# Altium schematic symbol library jlcpcb_2025_04_inductors_extended_0805.schlib: 882 symbols (part 2 of 5) (continued)
## FHW0805UC036JGT (continued)
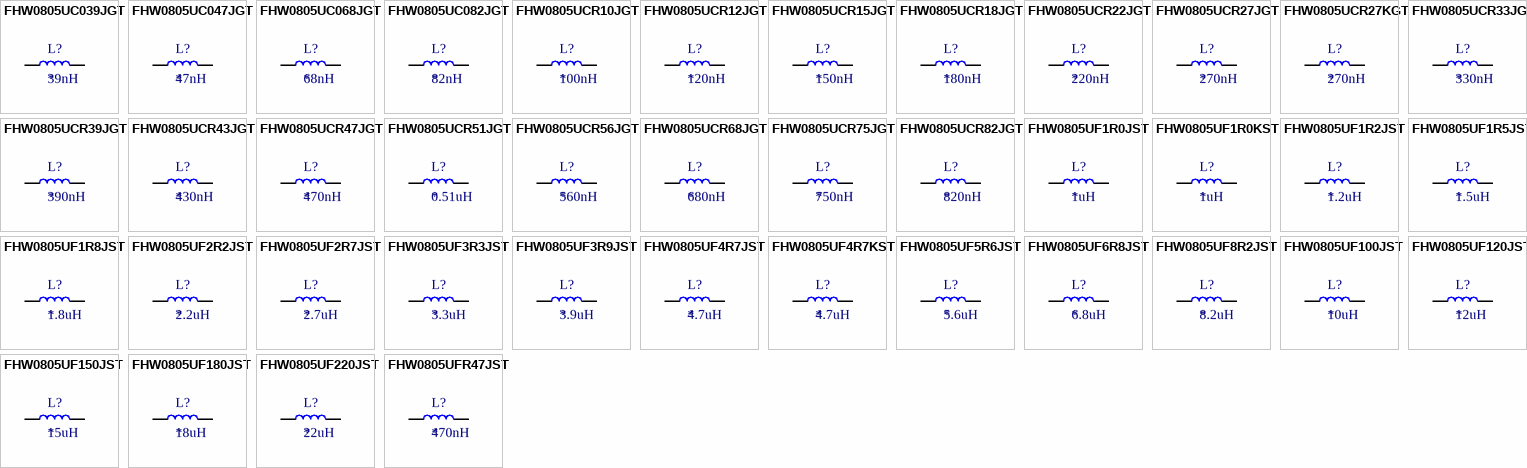
[diagram p7: symbols FHW0805UC039JGT to FHW0805UFR47JST]

## FHW0805UC039JGT
designator L?  Inductance: 39nH
Inductor, 39nH, ±5%, 290mΩ, 500mA, SMD 0805; Manufacturer: FH(Guangdong Fenghua Advanced Tech); Manufacturer Part Number: FHW0805UC039JGT; Self-Resonant Frequency: 2GHz; Q Factor: 55@500MHz; Package Size: 0805; JLCPCB Basic Part: No; JLCPCB Part Number: C112912; Supplier 1: LCSC; Category: Inductors; Supplier Part Number 1: C112912; Tolerance: ±5%; Rated Current: 500mA; DC Resistance: 290mΩ; RoHS: Yes; ComponentLink1Description: Datasheet; ComponentLink1URL: https://wmsc.lcsc.com/wmsc/upload/file/pdf/v2/lcsc/2302231030_FH--Guangdong-Fenghua-Advanced-Tech-FHW0805UC039JGT_C112912.pdf; ComponentLink2Description: JLCPCB Part URL; ComponentLink2URL: https://jlcpcb.com/partdetail/C112912; ComponentLink3Description: LCSC Part URL; ComponentLink3URL: https://lcsc.com/product-detail/Inductors-SMD_FH-Guangdong-Fenghua-Advanced-Tech-FH-Guangdong-Fenghua-Advanced-Tech-FHW0805UC039JGT_C112912.html
footprint IND-0805 (0805 (2012M) Inductor)
pins: 1, 2

## FHW0805UC047JGT
designator L?  Inductance: 47nH
Inductor, 47nH, ±5%, 310mΩ, 500mA, SMD 0805; Manufacturer: FH(Guangdong Fenghua Advanced Tech); Manufacturer Part Number: FHW0805UC047JGT; Self-Resonant Frequency: 1.65GHz; Q Factor: 55@500MHz; Package Size: 0805; JLCPCB Basic Part: No; JLCPCB Part Number: C113330; Supplier 1: LCSC; Category: Inductors; Supplier Part Number 1: C113330; Tolerance: ±5%; Rated Current: 500mA; DC Resistance: 310mΩ; RoHS: Yes; ComponentLink1Description: Datasheet; ComponentLink1URL: https://wmsc.lcsc.com/wmsc/upload/file/pdf/v2/lcsc/2302231030_FH--Guangdong-Fenghua-Advanced-Tech-FHW0805UC047JGT_C113330.pdf; ComponentLink2Description: JLCPCB Part URL; ComponentLink2URL: https://jlcpcb.com/partdetail/C113330; ComponentLink3Description: LCSC Part URL; ComponentLink3URL: https://lcsc.com/product-detail/Inductors-SMD_FH-Guangdong-Fenghua-Advanced-Tech-FH-Guangdong-Fenghua-Advanced-Tech-FHW0805UC047JGT_C113330.html
footprint IND-0805 (0805 (2012M) Inductor)
pins: 1, 2

## FHW0805UC068JGT
designator L?  Inductance: 68nH
Inductor, 68nH, ±5%, 380mΩ, 500mA, SMD 0805; Manufacturer: FH(Guangdong Fenghua Advanced Tech); Manufacturer Part Number: FHW0805UC068JGT; Self-Resonant Frequency: 1.45GHz; Q Factor: 55@500MHz; Package Size: 0805; JLCPCB Basic Part: No; JLCPCB Part Number: C113329; Supplier 1: LCSC; Category: Inductors; Supplier Part Number 1: C113329; Tolerance: ±5%; Rated Current: 500mA; DC Resistance: 380mΩ; RoHS: Yes; ComponentLink1Description: Datasheet; ComponentLink1URL: https://wmsc.lcsc.com/wmsc/upload/file/pdf/v2/lcsc/2302231030_FH--Guangdong-Fenghua-Advanced-Tech-FHW0805UC068JGT_C113329.pdf; ComponentLink2Description: JLCPCB Part URL; ComponentLink2URL: https://jlcpcb.com/partdetail/C113329; ComponentLink3Description: LCSC Part URL; ComponentLink3URL: https://lcsc.com/product-detail/Inductors-SMD_FH-Guangdong-Fenghua-Advanced-Tech-FH-Guangdong-Fenghua-Advanced-Tech-FHW0805UC068JGT_C113329.html
footprint IND-0805 (0805 (2012M) Inductor)
pins: 1, 2

## FHW0805UC082JGT
designator L?  Inductance: 82nH
Inductor, 82nH, ±5%, 420mΩ, 400mA, SMD 0805; Manufacturer: FH(Guangdong Fenghua Advanced Tech); Manufacturer Part Number: FHW0805UC082JGT; Self-Resonant Frequency: 1.3GHz; Q Factor: 55@500MHz; Package Size: 0805; JLCPCB Basic Part: No; JLCPCB Part Number: C108961; Supplier 1: LCSC; Category: Inductors; Supplier Part Number 1: C108961; Tolerance: ±5%; Rated Current: 400mA; DC Resistance: 420mΩ; RoHS: Yes; ComponentLink1Description: Datasheet; ComponentLink1URL: https://wmsc.lcsc.com/wmsc/upload/file/pdf/v2/lcsc/2302231030_FH--Guangdong-Fenghua-Advanced-Tech-FHW0805UC082JGT_C108961.pdf; ComponentLink2Description: JLCPCB Part URL; ComponentLink2URL: https://jlcpcb.com/partdetail/C108961; ComponentLink3Description: LCSC Part URL; ComponentLink3URL: https://lcsc.com/product-detail/Inductors-SMD_FH-Guangdong-Fenghua-Advanced-Tech-FH-Guangdong-Fenghua-Advanced-Tech-FHW0805UC082JGT_C108961.html
footprint IND-0805 (0805 (2012M) Inductor)
pins: 1, 2

## FHW0805UCR10JGT
designator L?  Inductance: 100nH
Inductor, 100nH, ±5%, 460mΩ, 400mA, SMD 0805; Manufacturer: FH(Guangdong Fenghua Advanced Tech); Manufacturer Part Number: FHW0805UCR10JGT; Self-Resonant Frequency: 1.2GHz; Q Factor: 50@500MHz; Package Size: 0805; JLCPCB Basic Part: No; JLCPCB Part Number: C108075; Supplier 1: LCSC; Category: Inductors; Supplier Part Number 1: C108075; Tolerance: ±5%; Rated Current: 400mA; DC Resistance: 460mΩ; RoHS: Yes; ComponentLink1Description: Datasheet; ComponentLink1URL: https://wmsc.lcsc.com/wmsc/upload/file/pdf/v2/lcsc/2302231030_FH--Guangdong-Fenghua-Advanced-Tech-FHW0805UCR10JGT_C108075.pdf; ComponentLink2Description: JLCPCB Part URL; ComponentLink2URL: https://jlcpcb.com/partdetail/C108075; ComponentLink3Description: LCSC Part URL; ComponentLink3URL: https://lcsc.com/product-detail/Inductors-SMD_FH-Guangdong-Fenghua-Advanced-Tech-FH-Guangdong-Fenghua-Advanced-Tech-FHW0805UCR10JGT_C108075.html
footprint IND-0805 (0805 (2012M) Inductor)
pins: 1, 2

## FHW0805UCR12JGT
designator L?  Inductance: 120nH
Inductor, 120nH, ±5%, 510mΩ, 400mA, SMD 0805; Manufacturer: FH(Guangdong Fenghua Advanced Tech); Manufacturer Part Number: FHW0805UCR12JGT; Self-Resonant Frequency: 1.1GHz; Q Factor: 45@250MHz; Package Size: 0805; JLCPCB Basic Part: No; JLCPCB Part Number: C139260; Supplier 1: LCSC; Category: Inductors; Supplier Part Number 1: C139260; Tolerance: ±5%; Rated Current: 400mA; DC Resistance: 510mΩ; RoHS: Yes; ComponentLink1Description: Datasheet; ComponentLink1URL: https://wmsc.lcsc.com/wmsc/upload/file/pdf/v2/lcsc/2302231230_FH--Guangdong-Fenghua-Advanced-Tech-FHW0805UCR12JGT_C139260.pdf; ComponentLink2Description: JLCPCB Part URL; ComponentLink2URL: https://jlcpcb.com/partdetail/C139260; ComponentLink3Description: LCSC Part URL; ComponentLink3URL: https://lcsc.com/product-detail/Inductors-SMD_FH-Guangdong-Fenghua-Advanced-Tech-FH-Guangdong-Fenghua-Advanced-Tech-FHW0805UCR12JGT_C139260.html
footprint IND-0805 (0805 (2012M) Inductor)
pins: 1, 2

## FHW0805UCR15JGT
designator L?  Inductance: 150nH
Inductor, 150nH, ±5%, 560mΩ, 400mA, SMD 0805; Manufacturer: FH(Guangdong Fenghua Advanced Tech); Manufacturer Part Number: FHW0805UCR15JGT; Self-Resonant Frequency: 920MHz; Q Factor: 45@250MHz; Package Size: 0805; JLCPCB Basic Part: No; JLCPCB Part Number: C139261; Supplier 1: LCSC; Category: Inductors; Supplier Part Number 1: C139261; Tolerance: ±5%; Rated Current: 400mA; DC Resistance: 560mΩ; RoHS: Yes; ComponentLink1Description: Datasheet; ComponentLink1URL: https://wmsc.lcsc.com/wmsc/upload/file/pdf/v2/lcsc/2302231230_FH--Guangdong-Fenghua-Advanced-Tech-FHW0805UCR15JGT_C139261.pdf; ComponentLink2Description: JLCPCB Part URL; ComponentLink2URL: https://jlcpcb.com/partdetail/C139261; ComponentLink3Description: LCSC Part URL; ComponentLink3URL: https://lcsc.com/product-detail/Inductors-SMD_FH-Guangdong-Fenghua-Advanced-Tech-FH-Guangdong-Fenghua-Advanced-Tech-FHW0805UCR15JGT_C139261.html
footprint IND-0805 (0805 (2012M) Inductor)
pins: 1, 2

## FHW0805UCR18JGT
designator L?  Inductance: 180nH
Inductor, 180nH, ±5%, 640mΩ, 400mA, SMD 0805; Manufacturer: FH(Guangdong Fenghua Advanced Tech); Manufacturer Part Number: FHW0805UCR18JGT; Self-Resonant Frequency: 870MHz; Q Factor: 45@250MHz; Package Size: 0805; JLCPCB Basic Part: No; JLCPCB Part Number: C75638; Supplier 1: LCSC; Category: Inductors; Supplier Part Number 1: C75638; Tolerance: ±5%; Rated Current: 400mA; DC Resistance: 640mΩ; RoHS: Yes; ComponentLink1Description: Datasheet; ComponentLink1URL: https://wmsc.lcsc.com/wmsc/upload/file/pdf/v2/lcsc/2302231101_FH--Guangdong-Fenghua-Advanced-Tech-FHW0805UCR18JGT_C75638.pdf; ComponentLink2Description: JLCPCB Part URL; ComponentLink2URL: https://jlcpcb.com/partdetail/C75638; ComponentLink3Description: LCSC Part URL; ComponentLink3URL: https://lcsc.com/product-detail/Inductors-SMD_FH-Guangdong-Fenghua-Advanced-Tech-FH-Guangdong-Fenghua-Advanced-Tech-FHW0805UCR18JGT_C75638.html
footprint IND-0805 (0805 (2012M) Inductor)
pins: 1, 2

## FHW0805UCR22JGT
designator L?  Inductance: 220nH
Inductor, 220nH, ±5%, 1.05Ω, 400mA, SMD 0805; Manufacturer: FH(Guangdong Fenghua Advanced Tech); Manufacturer Part Number: FHW0805UCR22JGT; Self-Resonant Frequency: 850MHz; Q Factor: 40@250MHz; Package Size: 0805; JLCPCB Basic Part: No; JLCPCB Part Number: C108960; Supplier 1: LCSC; Category: Inductors; Supplier Part Number 1: C108960; Tolerance: ±5%; Rated Current: 400mA; DC Resistance: 1.05Ω; RoHS: Yes; ComponentLink1Description: Datasheet; ComponentLink1URL: https://wmsc.lcsc.com/wmsc/upload/file/pdf/v2/lcsc/2302231030_FH--Guangdong-Fenghua-Advanced-Tech-FHW0805UCR22JGT_C108960.pdf; ComponentLink2Description: JLCPCB Part URL; ComponentLink2URL: https://jlcpcb.com/partdetail/C108960; ComponentLink3Description: LCSC Part URL; ComponentLink3URL: https://lcsc.com/product-detail/Inductors-SMD_FH-Guangdong-Fenghua-Advanced-Tech-FH-Guangdong-Fenghua-Advanced-Tech-FHW0805UCR22JGT_C108960.html
footprint IND-0805 (0805 (2012M) Inductor)
pins: 1, 2

## FHW0805UCR27JGT
designator L?  Inductance: 270nH
Inductor, 270nH, ±5%, 1.1Ω, 350mA, SMD 0805; Manufacturer: FH(Guangdong Fenghua Advanced Tech); Manufacturer Part Number: FHW0805UCR27JGT; Self-Resonant Frequency: 650MHz; Q Factor: 40@250MHz; Package Size: 0805; JLCPCB Basic Part: No; JLCPCB Part Number: C139262; Supplier 1: LCSC; Category: Inductors; Supplier Part Number 1: C139262; Tolerance: ±5%; Rated Current: 350mA; DC Resistance: 1.1Ω; RoHS: Yes; ComponentLink1Description: Datasheet; ComponentLink1URL: https://wmsc.lcsc.com/wmsc/upload/file/pdf/v2/lcsc/2302231230_FH--Guangdong-Fenghua-Advanced-Tech-FHW0805UCR27JGT_C139262.pdf; ComponentLink2Description: JLCPCB Part URL; ComponentLink2URL: https://jlcpcb.com/partdetail/C139262; ComponentLink3Description: LCSC Part URL; ComponentLink3URL: https://lcsc.com/product-detail/Inductors-SMD_FH-Guangdong-Fenghua-Advanced-Tech-FH-Guangdong-Fenghua-Advanced-Tech-FHW0805UCR27JGT_C139262.html
footprint IND-0805 (0805 (2012M) Inductor)
pins: 1, 2

## FHW0805UCR27KGT
designator L?  Inductance: 270nH
Inductor, 270nH, ±10%, 1.1Ω, 350mA, SMD 0805; Manufacturer: FH(Guangdong Fenghua Advanced Tech); Manufacturer Part Number: FHW0805UCR27KGT; Package Size: 0805; JLCPCB Basic Part: No; JLCPCB Part Number: C295705; Supplier 1: LCSC; Category: Inductors; Supplier Part Number 1: C295705; Tolerance: ±10%; Rated Current: 350mA; DC Resistance: 1.1Ω; RoHS: Yes; ComponentLink1Description: Datasheet; ComponentLink1URL: https://wmsc.lcsc.com/wmsc/upload/file/pdf/v2/lcsc/2302231208_FH--Guangdong-Fenghua-Advanced-Tech-FHW0805UCR27KGT_C295705.pdf; ComponentLink2Description: JLCPCB Part URL; ComponentLink2URL: https://jlcpcb.com/partdetail/C295705; ComponentLink3Description: LCSC Part URL; ComponentLink3URL: https://lcsc.com/product-detail/Inductors-SMD_FH-Guangdong-Fenghua-Advanced-Tech-FH-Guangdong-Fenghua-Advanced-Tech-FHW0805UCR27KGT_C295705.html
footprint IND-0805 (0805 (2012M) Inductor)
pins: 1, 2

## FHW0805UCR33JGT
designator L?  Inductance: 330nH
Inductor, 330nH, ±5%, 1.4Ω, 310mA, SMD 0805; Manufacturer: FH(Guangdong Fenghua Advanced Tech); Manufacturer Part Number: FHW0805UCR33JGT; Self-Resonant Frequency: 600MHz; Q Factor: 40@250MHz; Package Size: 0805; JLCPCB Basic Part: No; JLCPCB Part Number: C139263; Supplier 1: LCSC; Category: Inductors; Supplier Part Number 1: C139263; Tolerance: ±5%; Rated Current: 310mA; DC Resistance: 1.4Ω; RoHS: Yes; ComponentLink1Description: Datasheet; ComponentLink1URL: https://wmsc.lcsc.com/wmsc/upload/file/pdf/v2/lcsc/2302231230_FH--Guangdong-Fenghua-Advanced-Tech-FHW0805UCR33JGT_C139263.pdf; ComponentLink2Description: JLCPCB Part URL; ComponentLink2URL: https://jlcpcb.com/partdetail/C139263; ComponentLink3Description: LCSC Part URL; ComponentLink3URL: https://lcsc.com/product-detail/Inductors-SMD_FH-Guangdong-Fenghua-Advanced-Tech-FH-Guangdong-Fenghua-Advanced-Tech-FHW0805UCR33JGT_C139263.html
footprint IND-0805 (0805 (2012M) Inductor)
pins: 1, 2

## FHW0805UCR39JGT
designator L?  Inductance: 390nH
Inductor, 390nH, ±5%, 1.5Ω, 290mA, SMD 0805; Manufacturer: FH(Guangdong Fenghua Advanced Tech); Manufacturer Part Number: FHW0805UCR39JGT; Self-Resonant Frequency: 560MHz; Q Factor: 40@250MHz; Package Size: 0805; JLCPCB Basic Part: No; JLCPCB Part Number: C108076; Supplier 1: LCSC; Category: Inductors; Supplier Part Number 1: C108076; Tolerance: ±5%; Rated Current: 290mA; DC Resistance: 1.5Ω; RoHS: Yes; ComponentLink1Description: Datasheet; ComponentLink1URL: https://wmsc.lcsc.com/wmsc/upload/file/pdf/v2/lcsc/2302231030_FH--Guangdong-Fenghua-Advanced-Tech-FHW0805UCR39JGT_C108076.pdf; ComponentLink2Description: JLCPCB Part URL; ComponentLink2URL: https://jlcpcb.com/partdetail/C108076; ComponentLink3Description: LCSC Part URL; ComponentLink3URL: https://lcsc.com/product-detail/Inductors-SMD_FH-Guangdong-Fenghua-Advanced-Tech-FH-Guangdong-Fenghua-Advanced-Tech-FHW0805UCR39JGT_C108076.html
footprint IND-0805 (0805 (2012M) Inductor)
pins: 1, 2

## FHW0805UCR43JGT
designator L?  Inductance: 430nH
Inductor, 430nH, ±5%, SMD 0805; Manufacturer: FH(Guangdong Fenghua Advanced Tech); Manufacturer Part Number: FHW0805UCR43JGT; Package Size: 0805; JLCPCB Basic Part: No; JLCPCB Part Number: C395042; Supplier 1: LCSC; Category: Inductors; Supplier Part Number 1: C395042; Tolerance: ±5%; RoHS: Yes; ComponentLink1Description: Datasheet; ComponentLink1URL: https://wmsc.lcsc.com/wmsc/upload/file/pdf/v2/lcsc/2302231208_FH--Guangdong-Fenghua-Advanced-Tech-FHW0805UCR43JGT_C395042.pdf; ComponentLink2Description: JLCPCB Part URL; ComponentLink2URL: https://jlcpcb.com/partdetail/C395042; ComponentLink3Description: LCSC Part URL; ComponentLink3URL: https://lcsc.com/product-detail/Inductors-SMD_FH-Guangdong-Fenghua-Advanced-Tech-FH-Guangdong-Fenghua-Advanced-Tech-FHW0805UCR43JGT_C395042.html
footprint IND-0805 (0805 (2012M) Inductor)
pins: 1, 2

## FHW0805UCR47JGT
designator L?  Inductance: 470nH
Inductor, 470nH, ±5%, 2Ω, 250mA, SMD 0805; Manufacturer: FH(Guangdong Fenghua Advanced Tech); Manufacturer Part Number: FHW0805UCR47JGT; Self-Resonant Frequency: 375MHz; Q Factor: 33@100MHz; Package Size: 0805; JLCPCB Basic Part: No; JLCPCB Part Number: C115159; Supplier 1: LCSC; Category: Inductors; Supplier Part Number 1: C115159; Tolerance: ±5%; Rated Current: 250mA; DC Resistance: 2Ω; RoHS: Yes; ComponentLink1Description: Datasheet; ComponentLink1URL: https://wmsc.lcsc.com/wmsc/upload/file/pdf/v2/lcsc/2302231230_FH--Guangdong-Fenghua-Advanced-Tech-FHW0805UCR47JGT_C115159.pdf; ComponentLink2Description: JLCPCB Part URL; ComponentLink2URL: https://jlcpcb.com/partdetail/C115159; ComponentLink3Description: LCSC Part URL; ComponentLink3URL: https://lcsc.com/product-detail/Inductors-SMD_FH-Guangdong-Fenghua-Advanced-Tech-FH-Guangdong-Fenghua-Advanced-Tech-FHW0805UCR47JGT_C115159.html
footprint IND-0805 (0805 (2012M) Inductor)
pins: 1, 2

## FHW0805UCR51JGT
designator L?  Inductance: 0.51uH
Inductor, 0.51uH, ±5%, SMD 0805; Manufacturer: FH (Guangdong Fenghua Advanced Tech); Manufacturer Part Number: FHW0805UCR51JGT; Package Size: 0805; JLCPCB Basic Part: No; JLCPCB Part Number: C433880; Supplier 1: LCSC; Category: Inductors; Supplier Part Number 1: C433880; Tolerance: ±5%; RoHS: Yes; ComponentLink1Description: Datasheet; ComponentLink1URL: https://wmsc.lcsc.com/wmsc/upload/file/pdf/v2/lcsc/2302231130_FH--Guangdong-Fenghua-Advanced-Tech-FHW0805UCR51JGT_C433880.pdf; ComponentLink2Description: JLCPCB Part URL; ComponentLink2URL: https://jlcpcb.com/partdetail/C433880; ComponentLink3Description: LCSC Part URL; ComponentLink3URL: https://lcsc.com/product-detail/Inductors-SMD_FH-Guangdong-Fenghua-Advanced-Tech-FH-Guangdong-Fenghua-Advanced-Tech-FHW0805UCR51JGT_C433880.html
footprint IND-0805 (0805 (2012M) Inductor)
pins: 1, 2

## FHW0805UCR56JGT
designator L?  Inductance: 560nH
Inductor, 560nH, ±5%, 1.9Ω, 230mA, SMD 0805; Manufacturer: FH(Guangdong Fenghua Advanced Tech); Manufacturer Part Number: FHW0805UCR56JGT; Self-Resonant Frequency: 340MHz; Q Factor: 23@50MHz; Package Size: 0805; JLCPCB Basic Part: No; JLCPCB Part Number: C139264; Supplier 1: LCSC; Category: Inductors; Supplier Part Number 1: C139264; Tolerance: ±5%; Rated Current: 230mA; DC Resistance: 1.9Ω; RoHS: Yes; ComponentLink1Description: Datasheet; ComponentLink1URL: https://wmsc.lcsc.com/wmsc/upload/file/pdf/v2/lcsc/2302231230_FH--Guangdong-Fenghua-Advanced-Tech-FHW0805UCR56JGT_C139264.pdf; ComponentLink2Description: JLCPCB Part URL; ComponentLink2URL: https://jlcpcb.com/partdetail/C139264; ComponentLink3Description: LCSC Part URL; ComponentLink3URL: https://lcsc.com/product-detail/Inductors-SMD_FH-Guangdong-Fenghua-Advanced-Tech-FH-Guangdong-Fenghua-Advanced-Tech-FHW0805UCR56JGT_C139264.html
footprint IND-0805 (0805 (2012M) Inductor)
pins: 1, 2

## FHW0805UCR68JGT
designator L?  Inductance: 680nH
Inductor, 680nH, ±5%, 2.1Ω, 190mA, SMD 0805; Manufacturer: FH(Guangdong Fenghua Advanced Tech); Manufacturer Part Number: FHW0805UCR68JGT; Self-Resonant Frequency: 300MHz; Q Factor: 23@50MHz; Package Size: 0805; JLCPCB Basic Part: No; JLCPCB Part Number: C62554; Supplier 1: LCSC; Category: Inductors; Supplier Part Number 1: C62554; Tolerance: ±5%; Rated Current: 190mA; DC Resistance: 2.1Ω; RoHS: Yes; ComponentLink1Description: Datasheet; ComponentLink1URL: https://wmsc.lcsc.com/wmsc/upload/file/pdf/v2/lcsc/2302231300_FH--Guangdong-Fenghua-Advanced-Tech-FHW0805UCR68JGT_C62554.pdf; ComponentLink2Description: JLCPCB Part URL; ComponentLink2URL: https://jlcpcb.com/partdetail/C62554; ComponentLink3Description: LCSC Part URL; ComponentLink3URL: https://lcsc.com/product-detail/Inductors-SMD_FH-Guangdong-Fenghua-Advanced-Tech-FH-Guangdong-Fenghua-Advanced-Tech-FHW0805UCR68JGT_C62554.html
footprint IND-0805 (0805 (2012M) Inductor)
pins: 1, 2

## FHW0805UCR75JGT
designator L?  Inductance: 750nH
Inductor, 750nH, ±5%, SMD 0805; Manufacturer: FH(Guangdong Fenghua Advanced Tech); Manufacturer Part Number: FHW0805UCR75JGT; Package Size: 0805; JLCPCB Basic Part: No; JLCPCB Part Number: C395043; Supplier 1: LCSC; Category: Inductors; Supplier Part Number 1: C395043; Tolerance: ±5%; RoHS: Yes; ComponentLink1Description: Datasheet; ComponentLink1URL: https://wmsc.lcsc.com/wmsc/upload/file/pdf/v2/lcsc/2302231208_FH--Guangdong-Fenghua-Advanced-Tech-FHW0805UCR75JGT_C395043.pdf; ComponentLink2Description: JLCPCB Part URL; ComponentLink2URL: https://jlcpcb.com/partdetail/C395043; ComponentLink3Description: LCSC Part URL; ComponentLink3URL: https://lcsc.com/product-detail/Inductors-SMD_FH-Guangdong-Fenghua-Advanced-Tech-FH-Guangdong-Fenghua-Advanced-Tech-FHW0805UCR75JGT_C395043.html
footprint IND-0805 (0805 (2012M) Inductor)
pins: 1, 2

## FHW0805UCR82JGT
designator L?  Inductance: 820nH
Inductor, 820nH, ±5%, 2.14Ω, 180mA, SMD 0805; Manufacturer: FH(Guangdong Fenghua Advanced Tech); Manufacturer Part Number: FHW0805UCR82JGT; Self-Resonant Frequency: 250MHz; Q Factor: 23@50MHz; Package Size: 0805; JLCPCB Basic Part: No; JLCPCB Part Number: C139265; Supplier 1: LCSC; Category: Inductors; Supplier Part Number 1: C139265; Tolerance: ±5%; Rated Current: 180mA; DC Resistance: 2.14Ω; RoHS: Yes; ComponentLink1Description: Datasheet; ComponentLink1URL: https://wmsc.lcsc.com/wmsc/upload/file/pdf/v2/lcsc/2302231230_FH--Guangdong-Fenghua-Advanced-Tech-FHW0805UCR82JGT_C139265.pdf; ComponentLink2Description: JLCPCB Part URL; ComponentLink2URL: https://jlcpcb.com/partdetail/C139265; ComponentLink3Description: LCSC Part URL; ComponentLink3URL: https://lcsc.com/product-detail/Inductors-SMD_FH-Guangdong-Fenghua-Advanced-Tech-FH-Guangdong-Fenghua-Advanced-Tech-FHW0805UCR82JGT_C139265.html
footprint IND-0805 (0805 (2012M) Inductor)
pins: 1, 2

## FHW0805UF1R0JST
designator L?  Inductance: 1uH
Inductor, 1uH, ±5%, 1Ω, 430mA, SMD 0805; Manufacturer: FH(Guangdong Fenghua Advanced Tech); Manufacturer Part Number: FHW0805UF1R0JST; Self-Resonant Frequency: 360MHz; Q Factor: 10@7.96MHz; Package Size: 0805; JLCPCB Basic Part: No; JLCPCB Part Number: C295706; Supplier 1: LCSC; Category: Inductors; Supplier Part Number 1: C295706; Tolerance: ±5%; Rated Current: 430mA; DC Resistance: 1Ω; RoHS: Yes; ComponentLink1Description: Datasheet; ComponentLink1URL: https://wmsc.lcsc.com/wmsc/upload/file/pdf/v2/lcsc/2303141830_FH--Guangdong-Fenghua-Advanced-Tech-FHW0805UF1R0JST_C295706.pdf; ComponentLink2Description: JLCPCB Part URL; ComponentLink2URL: https://jlcpcb.com/partdetail/C295706; ComponentLink3Description: LCSC Part URL; ComponentLink3URL: https://lcsc.com/product-detail/Inductors-SMD_FH-Guangdong-Fenghua-Advanced-Tech-FH-Guangdong-Fenghua-Advanced-Tech-FHW0805UF1R0JST_C295706.html
footprint IND-0805 (0805 (2012M) Inductor)
pins: 1, 2

## FHW0805UF1R0KST
designator L?  Inductance: 1uH
Inductor, 1uH, ±10%, 1Ω, 430mA, SMD 0805; Manufacturer: FH(Guangdong Fenghua Advanced Tech); Manufacturer Part Number: FHW0805UF1R0KST; Package Size: 0805; JLCPCB Basic Part: No; JLCPCB Part Number: C295707; Supplier 1: LCSC; Category: Inductors; Supplier Part Number 1: C295707; Tolerance: ±10%; Rated Current: 430mA; DC Resistance: 1Ω; RoHS: Yes; ComponentLink1Description: Datasheet; ComponentLink1URL: https://wmsc.lcsc.com/wmsc/upload/file/pdf/v2/lcsc/2303141830_FH--Guangdong-Fenghua-Advanced-Tech-FHW0805UF1R0KST_C295707.pdf; ComponentLink2Description: JLCPCB Part URL; ComponentLink2URL: https://jlcpcb.com/partdetail/C295707; ComponentLink3Description: LCSC Part URL; ComponentLink3URL: https://lcsc.com/product-detail/Inductors-SMD_FH-Guangdong-Fenghua-Advanced-Tech-FH-Guangdong-Fenghua-Advanced-Tech-FHW0805UF1R0KST_C295707.html
footprint IND-0805 (0805 (2012M) Inductor)
pins: 1, 2

## FHW0805UF1R2JST
designator L?  Inductance: 1.2uH
Inductor, 1.2uH, ±5%, 1.15Ω, 410mA, SMD 0805; Manufacturer: FH(Guangdong Fenghua Advanced Tech); Manufacturer Part Number: FHW0805UF1R2JST; Self-Resonant Frequency: 350MHz; Q Factor: 10@7.96MHz; Package Size: 0805; JLCPCB Basic Part: No; JLCPCB Part Number: C304276; Supplier 1: LCSC; Category: Inductors; Supplier Part Number 1: C304276; Tolerance: ±5%; Rated Current: 410mA; DC Resistance: 1.15Ω; RoHS: Yes; ComponentLink1Description: Datasheet; ComponentLink1URL: https://wmsc.lcsc.com/wmsc/upload/file/pdf/v2/lcsc/2303141830_FH--Guangdong-Fenghua-Advanced-Tech-FHW0805UF1R2JST_C304276.pdf; ComponentLink2Description: JLCPCB Part URL; ComponentLink2URL: https://jlcpcb.com/partdetail/C304276; ComponentLink3Description: LCSC Part URL; ComponentLink3URL: https://lcsc.com/product-detail/Inductors-SMD_FH-Guangdong-Fenghua-Advanced-Tech-FH-Guangdong-Fenghua-Advanced-Tech-FHW0805UF1R2JST_C304276.html
footprint IND-0805 (0805 (2012M) Inductor)
pins: 1, 2

## FHW0805UF1R5JST
designator L?  Inductance: 1.5uH
Inductor, 1.5uH, ±5%, 1.2Ω, 400mA, SMD 0805; Manufacturer: FH(Guangdong Fenghua Advanced Tech); Manufacturer Part Number: FHW0805UF1R5JST; Self-Resonant Frequency: 300MHz; Q Factor: 10@7.96MHz; Package Size: 0805; JLCPCB Basic Part: No; JLCPCB Part Number: C393989; Supplier 1: LCSC; Category: Inductors; Supplier Part Number 1: C393989; Tolerance: ±5%; Rated Current: 400mA; DC Resistance: 1.2Ω; RoHS: Yes; ComponentLink1Description: Datasheet; ComponentLink1URL: https://wmsc.lcsc.com/wmsc/upload/file/pdf/v2/lcsc/2303141830_FH--Guangdong-Fenghua-Advanced-Tech-FHW0805UF1R5JST_C393989.pdf; ComponentLink2Description: JLCPCB Part URL; ComponentLink2URL: https://jlcpcb.com/partdetail/C393989; ComponentLink3Description: LCSC Part URL; ComponentLink3URL: https://lcsc.com/product-detail/Inductors-SMD_FH-Guangdong-Fenghua-Advanced-Tech-FH-Guangdong-Fenghua-Advanced-Tech-FHW0805UF1R5JST_C393989.html
footprint IND-0805 (0805 (2012M) Inductor)
pins: 1, 2

## FHW0805UF1R8JST
designator L?  Inductance: 1.8uH
Inductor, 1.8uH, ±5%, 1.35Ω, 380mA, SMD 0805; Manufacturer: FH(Guangdong Fenghua Advanced Tech); Manufacturer Part Number: FHW0805UF1R8JST; Self-Resonant Frequency: 200MHz; Q Factor: 10@7.96MHz; Package Size: 0805; JLCPCB Basic Part: No; JLCPCB Part Number: C393990; Supplier 1: LCSC; Category: Inductors; Supplier Part Number 1: C393990; Tolerance: ±5%; Rated Current: 380mA; DC Resistance: 1.35Ω; RoHS: Yes; ComponentLink1Description: Datasheet; ComponentLink1URL: https://wmsc.lcsc.com/wmsc/upload/file/pdf/v2/lcsc/2303141830_FH--Guangdong-Fenghua-Advanced-Tech-FHW0805UF1R8JST_C393990.pdf; ComponentLink2Description: JLCPCB Part URL; ComponentLink2URL: https://jlcpcb.com/partdetail/C393990; ComponentLink3Description: LCSC Part URL; ComponentLink3URL: https://lcsc.com/product-detail/Inductors-SMD_FH-Guangdong-Fenghua-Advanced-Tech-FH-Guangdong-Fenghua-Advanced-Tech-FHW0805UF1R8JST_C393990.html
footprint IND-0805 (0805 (2012M) Inductor)
pins: 1, 2

## FHW0805UF2R2JST
designator L?  Inductance: 2.2uH
Inductor, 2.2uH, ±5%, 1.5Ω, 350mA, SMD 0805; Manufacturer: FH(Guangdong Fenghua Advanced Tech); Manufacturer Part Number: FHW0805UF2R2JST; Self-Resonant Frequency: 170MHz; Q Factor: 10@7.96MHz; Package Size: 0805; JLCPCB Basic Part: No; JLCPCB Part Number: C41651; Supplier 1: LCSC; Category: Inductors; Supplier Part Number 1: C41651; Tolerance: ±5%; Rated Current: 350mA; DC Resistance: 1.5Ω; RoHS: Yes; ComponentLink1Description: Datasheet; ComponentLink1URL: https://wmsc.lcsc.com/wmsc/upload/file/pdf/v2/lcsc/2303141900_FH--Guangdong-Fenghua-Advanced-Tech-FHW0805UF2R2JST_C41651.pdf; ComponentLink2Description: JLCPCB Part URL; ComponentLink2URL: https://jlcpcb.com/partdetail/C41651; ComponentLink3Description: LCSC Part URL; ComponentLink3URL: https://lcsc.com/product-detail/Inductors-SMD_FH-Guangdong-Fenghua-Advanced-Tech-FH-Guangdong-Fenghua-Advanced-Tech-FHW0805UF2R2JST_C41651.html
footprint IND-0805 (0805 (2012M) Inductor)
pins: 1, 2

## FHW0805UF2R7JST
designator L?  Inductance: 2.7uH
Inductor, 2.7uH, ±5%, 1.7Ω, 320mA, SMD 0805; Manufacturer: FH(Guangdong Fenghua Advanced Tech); Manufacturer Part Number: FHW0805UF2R7JST; Self-Resonant Frequency: 100MHz; Q Factor: 10@7.96MHz; Package Size: 0805; JLCPCB Basic Part: No; JLCPCB Part Number: C304277; Supplier 1: LCSC; Category: Inductors; Supplier Part Number 1: C304277; Tolerance: ±5%; Rated Current: 320mA; DC Resistance: 1.7Ω; RoHS: Yes; ComponentLink1Description: Datasheet; ComponentLink1URL: https://wmsc.lcsc.com/wmsc/upload/file/pdf/v2/lcsc/2303141830_FH--Guangdong-Fenghua-Advanced-Tech-FHW0805UF2R7JST_C304277.pdf; ComponentLink2Description: JLCPCB Part URL; ComponentLink2URL: https://jlcpcb.com/partdetail/C304277; ComponentLink3Description: LCSC Part URL; ComponentLink3URL: https://lcsc.com/product-detail/Inductors-SMD_FH-Guangdong-Fenghua-Advanced-Tech-FH-Guangdong-Fenghua-Advanced-Tech-FHW0805UF2R7JST_C304277.html
footprint IND-0805 (0805 (2012M) Inductor)
pins: 1, 2

## FHW0805UF3R3JST
designator L?  Inductance: 3.3uH
Inductor, 3.3uH, ±5%, 1.8Ω, 300mA, SMD 0805; Manufacturer: FH(Guangdong Fenghua Advanced Tech); Manufacturer Part Number: FHW0805UF3R3JST; Self-Resonant Frequency: 90MHz; Q Factor: 10@7.96MHz; Package Size: 0805; JLCPCB Basic Part: No; JLCPCB Part Number: C139266; Supplier 1: LCSC; Category: Inductors; Supplier Part Number 1: C139266; Tolerance: ±5%; Rated Current: 300mA; DC Resistance: 1.8Ω; RoHS: Yes; ComponentLink1Description: Datasheet; ComponentLink1URL: https://wmsc.lcsc.com/wmsc/upload/file/pdf/v2/lcsc/2303141900_FH--Guangdong-Fenghua-Advanced-Tech-FHW0805UF3R3JST_C139266.pdf; ComponentLink2Description: JLCPCB Part URL; ComponentLink2URL: https://jlcpcb.com/partdetail/C139266; ComponentLink3Description: LCSC Part URL; ComponentLink3URL: https://lcsc.com/product-detail/Inductors-SMD_FH-Guangdong-Fenghua-Advanced-Tech-FH-Guangdong-Fenghua-Advanced-Tech-FHW0805UF3R3JST_C139266.html
footprint IND-0805 (0805 (2012M) Inductor)
pins: 1, 2

## FHW0805UF3R9JST
designator L?  Inductance: 3.9uH
Inductor, 3.9uH, ±5%, 1.95Ω, 280mA, SMD 0805; Manufacturer: FH(Guangdong Fenghua Advanced Tech); Manufacturer Part Number: FHW0805UF3R9JST; Self-Resonant Frequency: 90MHz; Q Factor: 10@7.96MHz; Package Size: 0805; JLCPCB Basic Part: No; JLCPCB Part Number: C393991; Supplier 1: LCSC; Category: Inductors; Supplier Part Number 1: C393991; Tolerance: ±5%; Rated Current: 280mA; DC Resistance: 1.95Ω; RoHS: Yes; ComponentLink1Description: Datasheet; ComponentLink1URL: https://wmsc.lcsc.com/wmsc/upload/file/pdf/v2/lcsc/2303141830_FH--Guangdong-Fenghua-Advanced-Tech-FHW0805UF3R9JST_C393991.pdf; ComponentLink2Description: JLCPCB Part URL; ComponentLink2URL: https://jlcpcb.com/partdetail/C393991; ComponentLink3Description: LCSC Part URL; ComponentLink3URL: https://lcsc.com/product-detail/Inductors-SMD_FH-Guangdong-Fenghua-Advanced-Tech-FH-Guangdong-Fenghua-Advanced-Tech-FHW0805UF3R9JST_C393991.html
footprint IND-0805 (0805 (2012M) Inductor)
pins: 1, 2

## FHW0805UF4R7JST
designator L?  Inductance: 4.7uH
Inductor, 4.7uH, ±5%, 2.05Ω, 250mA, SMD 0805; Manufacturer: FH(Guangdong Fenghua Advanced Tech); Manufacturer Part Number: FHW0805UF4R7JST; Self-Resonant Frequency: 85MHz; Q Factor: 10@7.96MHz; Package Size: 0805; JLCPCB Basic Part: No; JLCPCB Part Number: C139136; Supplier 1: LCSC; Category: Inductors; Supplier Part Number 1: C139136; Tolerance: ±5%; Rated Current: 250mA; DC Resistance: 2.05Ω; RoHS: Yes; ComponentLink1Description: Datasheet; ComponentLink1URL: https://wmsc.lcsc.com/wmsc/upload/file/pdf/v2/lcsc/2303141900_FH--Guangdong-Fenghua-Advanced-Tech-FHW0805UF4R7JST_C139136.pdf; ComponentLink2Description: JLCPCB Part URL; ComponentLink2URL: https://jlcpcb.com/partdetail/C139136; ComponentLink3Description: LCSC Part URL; ComponentLink3URL: https://lcsc.com/product-detail/Inductors-SMD_FH-Guangdong-Fenghua-Advanced-Tech-FH-Guangdong-Fenghua-Advanced-Tech-FHW0805UF4R7JST_C139136.html
footprint IND-0805 (0805 (2012M) Inductor)
pins: 1, 2

## FHW0805UF4R7KST
designator L?  Inductance: 4.7uH
Inductor, 4.7uH, ±10%, 2.05Ω, 250mA, SMD 0805; Manufacturer: FH(Guangdong Fenghua Advanced Tech); Manufacturer Part Number: FHW0805UF4R7KST; Package Size: 0805; JLCPCB Basic Part: No; JLCPCB Part Number: C304278; Supplier 1: LCSC; Category: Inductors; Supplier Part Number 1: C304278; Tolerance: ±10%; Rated Current: 250mA; DC Resistance: 2.05Ω; RoHS: Yes; ComponentLink1Description: Datasheet; ComponentLink1URL: https://wmsc.lcsc.com/wmsc/upload/file/pdf/v2/lcsc/2303141830_FH--Guangdong-Fenghua-Advanced-Tech-FHW0805UF4R7KST_C304278.pdf; ComponentLink2Description: JLCPCB Part URL; ComponentLink2URL: https://jlcpcb.com/partdetail/C304278; ComponentLink3Description: LCSC Part URL; ComponentLink3URL: https://lcsc.com/product-detail/Inductors-SMD_FH-Guangdong-Fenghua-Advanced-Tech-FH-Guangdong-Fenghua-Advanced-Tech-FHW0805UF4R7KST_C304278.html
footprint IND-0805 (0805 (2012M) Inductor)
pins: 1, 2

## FHW0805UF5R6JST
designator L?  Inductance: 5.6uH
Inductor, 5.6uH, ±5%, 2.3Ω, 240mA, SMD 0805; Manufacturer: FH(Guangdong Fenghua Advanced Tech); Manufacturer Part Number: FHW0805UF5R6JST; Self-Resonant Frequency: 70MHz; Q Factor: 10@7.96MHz; Package Size: 0805; JLCPCB Basic Part: No; JLCPCB Part Number: C393992; Supplier 1: LCSC; Category: Inductors; Supplier Part Number 1: C393992; Tolerance: ±5%; Rated Current: 240mA; DC Resistance: 2.3Ω; RoHS: Yes; ComponentLink1Description: Datasheet; ComponentLink1URL: https://wmsc.lcsc.com/wmsc/upload/file/pdf/v2/lcsc/2303141830_FH--Guangdong-Fenghua-Advanced-Tech-FHW0805UF5R6JST_C393992.pdf; ComponentLink2Description: JLCPCB Part URL; ComponentLink2URL: https://jlcpcb.com/partdetail/C393992; ComponentLink3Description: LCSC Part URL; ComponentLink3URL: https://lcsc.com/product-detail/Inductors-SMD_FH-Guangdong-Fenghua-Advanced-Tech-FH-Guangdong-Fenghua-Advanced-Tech-FHW0805UF5R6JST_C393992.html
footprint IND-0805 (0805 (2012M) Inductor)
pins: 1, 2

## FHW0805UF6R8JST
designator L?  Inductance: 6.8uH
Inductor, 6.8uH, ±5%, 2.6Ω, 220mA, SMD 0805; Manufacturer: FH(Guangdong Fenghua Advanced Tech); Manufacturer Part Number: FHW0805UF6R8JST; Self-Resonant Frequency: 55MHz; Q Factor: 10@7.96MHz; Package Size: 0805; JLCPCB Basic Part: No; JLCPCB Part Number: C393993; Supplier 1: LCSC; Category: Inductors; Supplier Part Number 1: C393993; Tolerance: ±5%; Rated Current: 220mA; DC Resistance: 2.6Ω; RoHS: Yes; ComponentLink1Description: Datasheet; ComponentLink1URL: https://wmsc.lcsc.com/wmsc/upload/file/pdf/v2/lcsc/2303141830_FH--Guangdong-Fenghua-Advanced-Tech-FHW0805UF6R8JST_C393993.pdf; ComponentLink2Description: JLCPCB Part URL; ComponentLink2URL: https://jlcpcb.com/partdetail/C393993; ComponentLink3Description: LCSC Part URL; ComponentLink3URL: https://lcsc.com/product-detail/Inductors-SMD_FH-Guangdong-Fenghua-Advanced-Tech-FH-Guangdong-Fenghua-Advanced-Tech-FHW0805UF6R8JST_C393993.html
footprint IND-0805 (0805 (2012M) Inductor)
pins: 1, 2

## FHW0805UF8R2JST
designator L?  Inductance: 8.2uH
Inductor, 8.2uH, ±5%, 3Ω, 180mA, SMD 0805; Manufacturer: FH(Guangdong Fenghua Advanced Tech); Manufacturer Part Number: FHW0805UF8R2JST; Self-Resonant Frequency: 50MHz; Q Factor: 10@7.96MHz; Package Size: 0805; JLCPCB Basic Part: No; JLCPCB Part Number: C393994; Supplier 1: LCSC; Category: Inductors; Supplier Part Number 1: C393994; Tolerance: ±5%; Rated Current: 180mA; DC Resistance: 3Ω; RoHS: Yes; ComponentLink1Description: Datasheet; ComponentLink1URL: https://wmsc.lcsc.com/wmsc/upload/file/pdf/v2/lcsc/2303141830_FH--Guangdong-Fenghua-Advanced-Tech-FHW0805UF8R2JST_C393994.pdf; ComponentLink2Description: JLCPCB Part URL; ComponentLink2URL: https://jlcpcb.com/partdetail/C393994; ComponentLink3Description: LCSC Part URL; ComponentLink3URL: https://lcsc.com/product-detail/Inductors-SMD_FH-Guangdong-Fenghua-Advanced-Tech-FH-Guangdong-Fenghua-Advanced-Tech-FHW0805UF8R2JST_C393994.html
footprint IND-0805 (0805 (2012M) Inductor)
pins: 1, 2

## FHW0805UF100JST
designator L?  Inductance: 10uH
Inductor, 10uH, ±5%, 3.2Ω, 150mA, SMD 0805; Manufacturer: FH(Guangdong Fenghua Advanced Tech); Manufacturer Part Number: FHW0805UF100JST; Self-Resonant Frequency: 30MHz; Q Factor: 8@2.52MHz; Package Size: 0805; JLCPCB Basic Part: No; JLCPCB Part Number: C139135; Supplier 1: LCSC; Category: Inductors; Supplier Part Number 1: C139135; Tolerance: ±5%; Rated Current: 150mA; DC Resistance: 3.2Ω; RoHS: Yes; ComponentLink1Description: Datasheet; ComponentLink1URL: https://wmsc.lcsc.com/wmsc/upload/file/pdf/v2/lcsc/2303141900_FH--Guangdong-Fenghua-Advanced-Tech-FHW0805UF100JST_C139135.pdf; ComponentLink2Description: JLCPCB Part URL; ComponentLink2URL: https://jlcpcb.com/partdetail/C139135; ComponentLink3Description: LCSC Part URL; ComponentLink3URL: https://lcsc.com/product-detail/Inductors-SMD_FH-Guangdong-Fenghua-Advanced-Tech-FH-Guangdong-Fenghua-Advanced-Tech-FHW0805UF100JST_C139135.html
footprint IND-0805 (0805 (2012M) Inductor)
pins: 1, 2

## FHW0805UF120JST
designator L?  Inductance: 12uH
Inductor, 12uH, ±5%, 3.5Ω, 110mA, SMD 0805; Manufacturer: FH(Guangdong Fenghua Advanced Tech); Manufacturer Part Number: FHW0805UF120JST; Self-Resonant Frequency: 17MHz; Q Factor: 8@2.52MHz; Package Size: 0805; JLCPCB Basic Part: No; JLCPCB Part Number: C393995; Supplier 1: LCSC; Category: Inductors; Supplier Part Number 1: C393995; Tolerance: ±5%; Rated Current: 110mA; DC Resistance: 3.5Ω; RoHS: Yes; ComponentLink1Description: Datasheet; ComponentLink1URL: https://wmsc.lcsc.com/wmsc/upload/file/pdf/v2/lcsc/2303141830_FH--Guangdong-Fenghua-Advanced-Tech-FHW0805UF120JST_C393995.pdf; ComponentLink2Description: JLCPCB Part URL; ComponentLink2URL: https://jlcpcb.com/partdetail/C393995; ComponentLink3Description: LCSC Part URL; ComponentLink3URL: https://lcsc.com/product-detail/Inductors-SMD_FH-Guangdong-Fenghua-Advanced-Tech-FH-Guangdong-Fenghua-Advanced-Tech-FHW0805UF120JST_C393995.html
footprint IND-0805 (0805 (2012M) Inductor)
pins: 1, 2

## FHW0805UF150JST
designator L?  Inductance: 15uH
Inductor, 15uH, ±5%, 4.2Ω, 100mA, SMD 0805; Manufacturer: FH(Guangdong Fenghua Advanced Tech); Manufacturer Part Number: FHW0805UF150JST; Self-Resonant Frequency: 16MHz; Q Factor: 8@2.52MHz; Package Size: 0805; JLCPCB Basic Part: No; JLCPCB Part Number: C393996; Supplier 1: LCSC; Category: Inductors; Supplier Part Number 1: C393996; Tolerance: ±5%; Rated Current: 100mA; DC Resistance: 4.2Ω; RoHS: Yes; ComponentLink1Description: Datasheet; ComponentLink1URL: https://wmsc.lcsc.com/wmsc/upload/file/pdf/v2/lcsc/2303141830_FH--Guangdong-Fenghua-Advanced-Tech-FHW0805UF150JST_C393996.pdf; ComponentLink2Description: JLCPCB Part URL; ComponentLink2URL: https://jlcpcb.com/partdetail/C393996; ComponentLink3Description: LCSC Part URL; ComponentLink3URL: https://lcsc.com/product-detail/Inductors-SMD_FH-Guangdong-Fenghua-Advanced-Tech-FH-Guangdong-Fenghua-Advanced-Tech-FHW0805UF150JST_C393996.html
footprint IND-0805 (0805 (2012M) Inductor)
pins: 1, 2

## FHW0805UF180JST
designator L?  Inductance: 18uH
Inductor, 18uH, ±5%, 4.5Ω, 95mA, SMD 0805; Manufacturer: FH(Guangdong Fenghua Advanced Tech); Manufacturer Part Number: FHW0805UF180JST; Self-Resonant Frequency: 15MHz; Q Factor: 8@2.52MHz; Package Size: 0805; JLCPCB Basic Part: No; JLCPCB Part Number: C393997; Supplier 1: LCSC; Category: Inductors; Supplier Part Number 1: C393997; Tolerance: ±5%; Rated Current: 95mA; DC Resistance: 4.5Ω; RoHS: Yes; ComponentLink1Description: Datasheet; ComponentLink1URL: https://wmsc.lcsc.com/wmsc/upload/file/pdf/v2/lcsc/2303141830_FH--Guangdong-Fenghua-Advanced-Tech-FHW0805UF180JST_C393997.pdf; ComponentLink2Description: JLCPCB Part URL; ComponentLink2URL: https://jlcpcb.com/partdetail/C393997; ComponentLink3Description: LCSC Part URL; ComponentLink3URL: https://lcsc.com/product-detail/Inductors-SMD_FH-Guangdong-Fenghua-Advanced-Tech-FH-Guangdong-Fenghua-Advanced-Tech-FHW0805UF180JST_C393997.html
footprint IND-0805 (0805 (2012M) Inductor)
pins: 1, 2

## FHW0805UF220JST
designator L?  Inductance: 22uH
Inductor, 22uH, ±5%, 6Ω, 80mA, SMD 0805; Manufacturer: FH(Guangdong Fenghua Advanced Tech); Manufacturer Part Number: FHW0805UF220JST; Self-Resonant Frequency: 14MHz; Q Factor: 8@2.52MHz; Package Size: 0805; JLCPCB Basic Part: No; JLCPCB Part Number: C393998; Supplier 1: LCSC; Category: Inductors; Supplier Part Number 1: C393998; Tolerance: ±5%; Rated Current: 80mA; DC Resistance: 6Ω; RoHS: Yes; ComponentLink1Description: Datasheet; ComponentLink1URL: https://wmsc.lcsc.com/wmsc/upload/file/pdf/v2/lcsc/2303141830_FH--Guangdong-Fenghua-Advanced-Tech-FHW0805UF220JST_C393998.pdf; ComponentLink2Description: JLCPCB Part URL; ComponentLink2URL: https://jlcpcb.com/partdetail/C393998; ComponentLink3Description: LCSC Part URL; ComponentLink3URL: https://lcsc.com/product-detail/Inductors-SMD_FH-Guangdong-Fenghua-Advanced-Tech-FH-Guangdong-Fenghua-Advanced-Tech-FHW0805UF220JST_C393998.html
footprint IND-0805 (0805 (2012M) Inductor)
pins: 1, 2

## FHW0805UFR47JST
designator L?  Inductance: 470nH
Inductor, 470nH, ±5%, 400mΩ, 500mA, SMD 0805; Manufacturer: FH(Guangdong Fenghua Advanced Tech); Manufacturer Part Number: FHW0805UFR47JST; Self-Resonant Frequency: 450MHz; Q Factor: 10@25.2MHz; Package Size: 0805; JLCPCB Basic Part: No; JLCPCB Part Number: C393986; Supplier 1: LCSC; Category: Inductors; Supplier Part Number 1: C393986; Tolerance: ±5%; Rated Current: 500mA; DC Resistance: 400mΩ; RoHS: Yes; ComponentLink1Description: Datasheet; ComponentLink1URL: https://wmsc.lcsc.com/wmsc/upload/file/pdf/v2/lcsc/2303141830_FH--Guangdong-Fenghua-Advanced-Tech-FHW0805UFR47JST_C393986.pdf; ComponentLink2Description: JLCPCB Part URL; ComponentLink2URL: https://jlcpcb.com/partdetail/C393986; ComponentLink3Description: LCSC Part URL; ComponentLink3URL: https://lcsc.com/product-detail/Inductors-SMD_FH-Guangdong-Fenghua-Advanced-Tech-FH-Guangdong-Fenghua-Advanced-Tech-FHW0805UFR47JST_C393986.html
footprint IND-0805 (0805 (2012M) Inductor)
pins: 1, 2

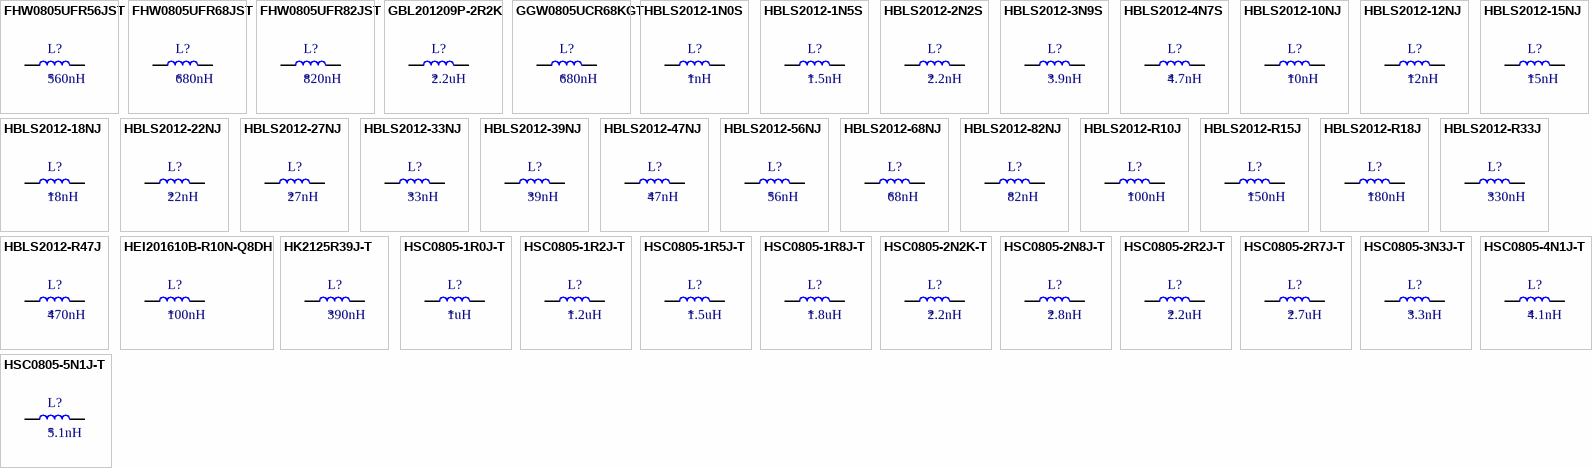
[diagram p8: symbols FHW0805UFR56JST to HSC0805-5N1J-T]

## FHW0805UFR56JST
designator L?  Inductance: 560nH
Inductor, 560nH, ±5%, 400mΩ, 500mA, SMD 0805; Manufacturer: FH(Guangdong Fenghua Advanced Tech); Manufacturer Part Number: FHW0805UFR56JST; Self-Resonant Frequency: 450MHz; Q Factor: 10@25.2MHz; Package Size: 0805; JLCPCB Basic Part: No; JLCPCB Part Number: C304279; Supplier 1: LCSC; Category: Inductors; Supplier Part Number 1: C304279; Tolerance: ±5%; Rated Current: 500mA; DC Resistance: 400mΩ; RoHS: Yes; ComponentLink1Description: Datasheet; ComponentLink1URL: https://wmsc.lcsc.com/wmsc/upload/file/pdf/v2/lcsc/2303141830_FH--Guangdong-Fenghua-Advanced-Tech-FHW0805UFR56JST_C304279.pdf; ComponentLink2Description: JLCPCB Part URL; ComponentLink2URL: https://jlcpcb.com/partdetail/C304279; ComponentLink3Description: LCSC Part URL; ComponentLink3URL: https://lcsc.com/product-detail/Inductors-SMD_FH-Guangdong-Fenghua-Advanced-Tech-FH-Guangdong-Fenghua-Advanced-Tech-FHW0805UFR56JST_C304279.html
footprint IND-0805 (0805 (2012M) Inductor)
pins: 1, 2

## FHW0805UFR68JST
designator L?  Inductance: 680nH
Inductor, 680nH, ±5%, 600mΩ, 500mA, SMD 0805; Manufacturer: FH(Guangdong Fenghua Advanced Tech); Manufacturer Part Number: FHW0805UFR68JST; Self-Resonant Frequency: 400MHz; Q Factor: 10@25.2MHz; Package Size: 0805; JLCPCB Basic Part: No; JLCPCB Part Number: C393987; Supplier 1: LCSC; Category: Inductors; Supplier Part Number 1: C393987; Tolerance: ±5%; Rated Current: 500mA; DC Resistance: 600mΩ; RoHS: Yes; ComponentLink1Description: Datasheet; ComponentLink1URL: https://wmsc.lcsc.com/wmsc/upload/file/pdf/v2/lcsc/2303141830_FH--Guangdong-Fenghua-Advanced-Tech-FHW0805UFR68JST_C393987.pdf; ComponentLink2Description: JLCPCB Part URL; ComponentLink2URL: https://jlcpcb.com/partdetail/C393987; ComponentLink3Description: LCSC Part URL; ComponentLink3URL: https://lcsc.com/product-detail/Inductors-SMD_FH-Guangdong-Fenghua-Advanced-Tech-FH-Guangdong-Fenghua-Advanced-Tech-FHW0805UFR68JST_C393987.html
footprint IND-0805 (0805 (2012M) Inductor)
pins: 1, 2

## FHW0805UFR82JST
designator L?  Inductance: 820nH
Inductor, 820nH, ±5%, 800mΩ, 500mA, SMD 0805; Manufacturer: FH(Guangdong Fenghua Advanced Tech); Manufacturer Part Number: FHW0805UFR82JST; Self-Resonant Frequency: 400MHz; Q Factor: 10@25.2MHz; Package Size: 0805; JLCPCB Basic Part: No; JLCPCB Part Number: C393988; Supplier 1: LCSC; Category: Inductors; Supplier Part Number 1: C393988; Tolerance: ±5%; Rated Current: 500mA; DC Resistance: 800mΩ; RoHS: Yes; ComponentLink1Description: Datasheet; ComponentLink1URL: https://wmsc.lcsc.com/wmsc/upload/file/pdf/v2/lcsc/2303141830_FH--Guangdong-Fenghua-Advanced-Tech-FHW0805UFR82JST_C393988.pdf; ComponentLink2Description: JLCPCB Part URL; ComponentLink2URL: https://jlcpcb.com/partdetail/C393988; ComponentLink3Description: LCSC Part URL; ComponentLink3URL: https://lcsc.com/product-detail/Inductors-SMD_FH-Guangdong-Fenghua-Advanced-Tech-FH-Guangdong-Fenghua-Advanced-Tech-FHW0805UFR82JST_C393988.html
footprint IND-0805 (0805 (2012M) Inductor)
pins: 1, 2
